# Altium footprint library TranDangKhoa-LIB.PcbLib: 1435 footprints (part 9 of 90)
Each footprint in its own frame and in the unit in brackets; x right, y up, seen from the top. Pads: shape width x height; smd on the part's side, far side on the other; paste and mask are expansions set on the pad; w line width, h text height; cw(c..) or ccw(c..) is an arc to the next point about the centre after c.
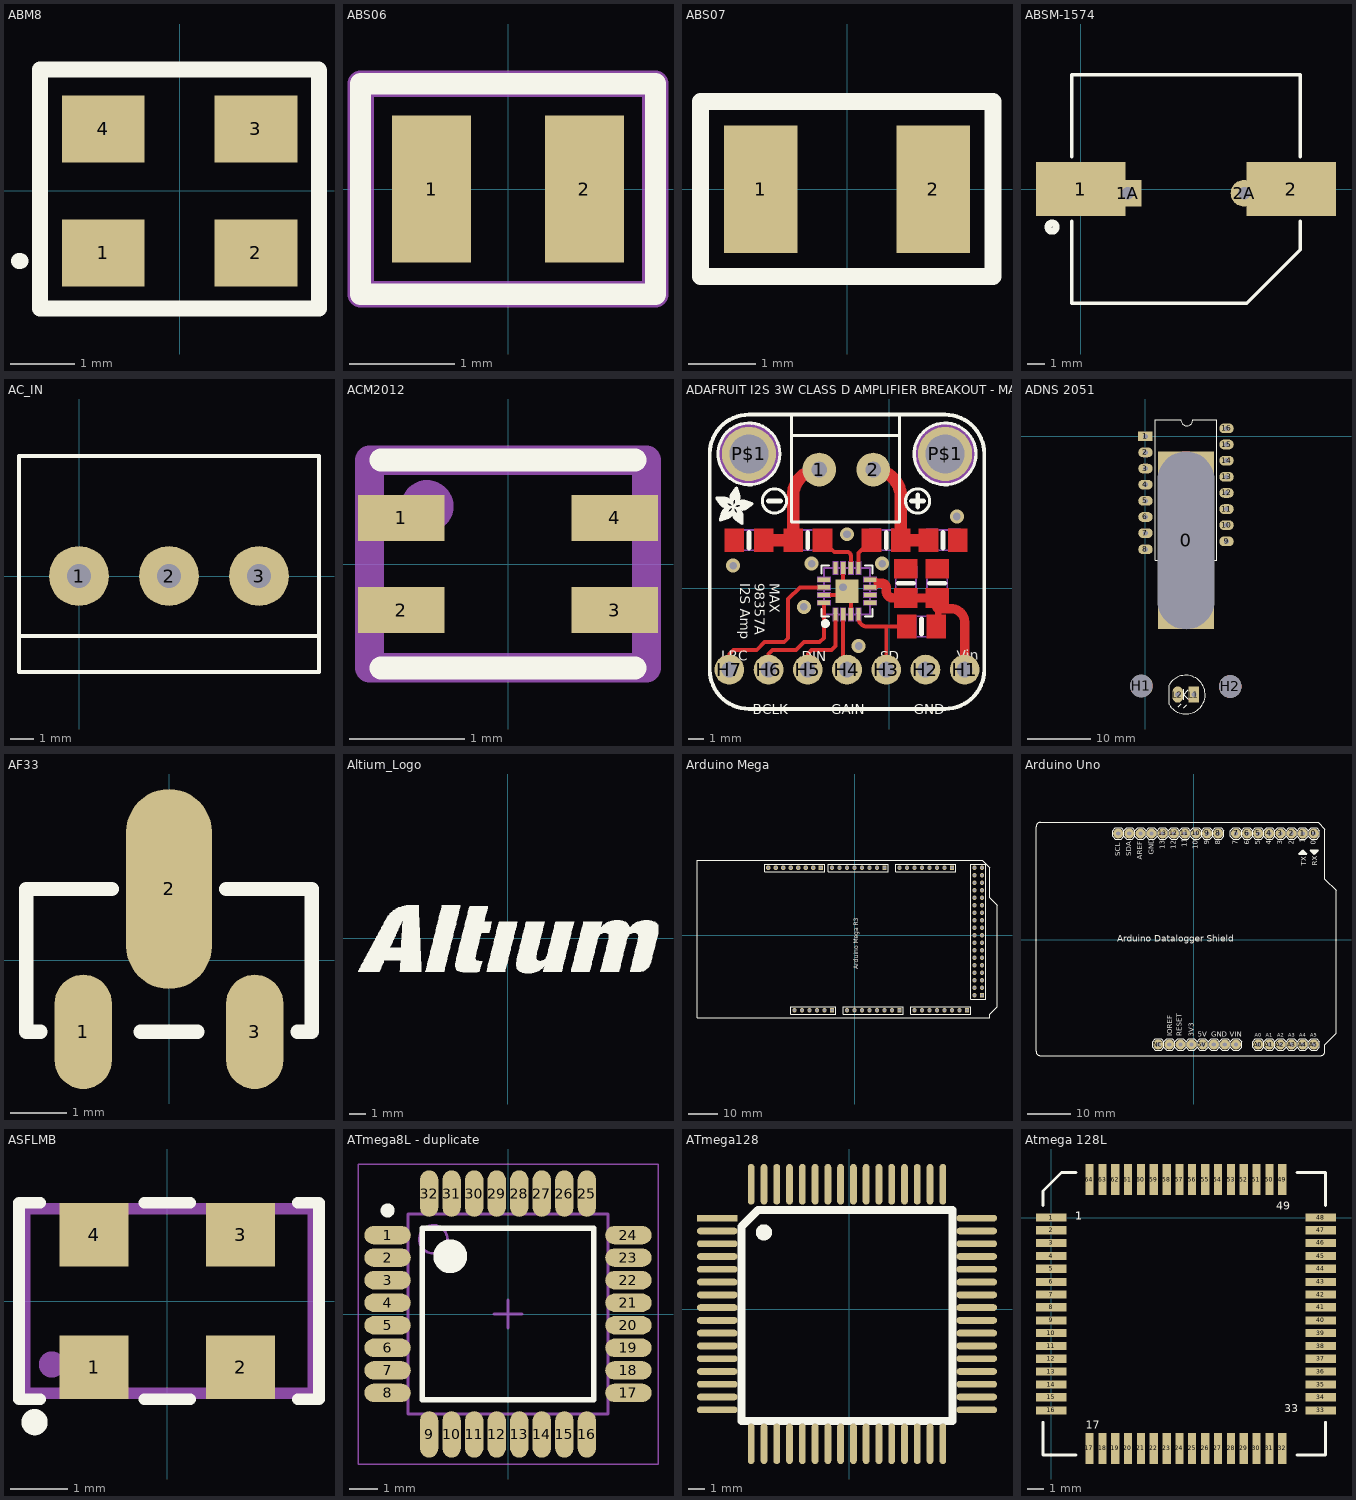
[diagram p8: the footprints below, top view; thin cyan lines are the x and y axes]

## ABM8 [mm] "HC-49US XTAL"
height 4.3
pads (4):
  rect 1.3x1.05 smd: 1(-1.2,-0.97) 2(1.19,-0.97) 3(1.19,0.97) 4(-1.2,0.97)
Top Overlay:
  lines w0.254: -2.52,-1.1 -2.5,-1.1 ; 1.25,1.9 2.17,1.9 2.18,1.89 2.18,-1.84 -2.19,-1.84 -2.19,1.9 2.1,1.9
3D body "ABM8.STEP": height 0.82, standoff 0.02, extent -1.587,-1.346 1.613,1.143

## ABS06 [mm]
pads (2):
  rect 0.75x1.4 smd: 1(-0.725,0) 2(0.725,0)
Top Overlay:
  lines w0.2: -1.4,-1 -1.4,0 -1.4,1 1.4,1 1.4,-1 -1.4,-1
Mechanical 16:
  lines w0.254: -1.4,-1 1.4,-1 1.4,1 -1.4,1 -1.4,-1
Mechanical 29:
  text ".Designator" at -0.5,-0.3 h0.6
3D body "ABS06.STEP": height 0.6, standoff 0, extent -1,-0.62 1,0.6
3D body: height 0.61, standoff 0.5, extent -0.825,-0.36 0.825,0.34

## ABS07 [mm] "HC-49US XTAL"
height 4.3
pads (2):
  rect 1.1x1.9 smd: 1(-1.29,0) 2(1.29,0)
Top Overlay:
  lines w0.254: -2.19,-1.3 2.18,-1.3 2.18,1.31 -2.19,1.31 -2.19,-1.3
3D body "ABS07.STEP": height 0.9, standoff 0.02, extent -1.6,-0.749 1.6,0.749

## ABSM-1574 [mm]
pads (4):
  rect 5x3 smd: 1(0,0) 2(11.8,0)
  rect 1.5x1.5 hole 0.7: 1A(2.65,-0.24)
  round 1.5 hole 0.7: 2A(9.15,-0.24)
Top Overlay:
  circle w0.4: c-1.6,-2.134 r0.227
  lines w0.2: -0.5,-1.8 -0.5,-6.4 9.3,-6.4 12.3,-3.4 12.3,-1.8 ; -0.5,1.8 -0.5,6.4 12.3,6.4 12.3,1.8

## AC_IN [mil] "AC_Input"
height 3
pads (3):
  round 100 hole 40 square: 1(0,0) 2(150,0) 3(300,0)
Top Overlay:
  lines w7: -100,-100 400,-100 ; -100,-160 -100,200 400,200 400,-160 -100,-160

## ACM2012 [mm]
pads (4):
  rect 0.75x0.4 smd mask+0.076: 1(-0.925,0.4) 2(-0.925,-0.4) 3(0.925,-0.4) 4(0.925,0.4)
Top Overlay:
  lines w0.2: -1.1,-0.9 1.1,-0.9 ; -1.1,0.9 1.1,0.9
Mechanical 16:
  circle w0.254: c-0.7,0.5 r0.1
  lines w0.254: -1.2,-0.9 -1.2,0.9 1.2,0.9 1.2,-0.9 -1.2,-0.9
Mechanical 29:
  text ".Designator" at 0.3,0.1 h0.4
3D body: height 1.3, standoff 0, extent -1.2,-0.7 1.2,0.7

## ADAFRUIT I2S 3W CLASS D AMPLIFIER BREAKOUT - MAX98357A [mil]
pads (28):
  round 86 hole 39.36 paste-99999 mask+4: 1(-178.62,301.98) 2(-40.83,301.98)
  rect 11.02x31.5 smd paste+0 mask+4: 1(-137.28,-67.08) 2(-117.59,-67.08) 3(-97.92,-67.08) 4(-78.22,-67.08) 9(-78.22,51.03) 10(-97.92,51.03) 11(-117.59,51.03) 12(-137.28,51.03)
  rect 31.5x11.02 smd paste+0 mask+4: 5(-48.7,-37.55) 6(-48.7,-17.86) 7(-48.7,1.82) 8(-48.7,21.51) 13(-166.81,21.51) 14(-166.81,1.82) 15(-166.81,-17.86) 16(-166.81,-37.55)
  round 76 hole 39.36 paste-99999 mask+4: H1(192.25,-208.02) H2(92.25,-208.02) H3(-7.75,-208.02) H4(-107.75,-208.02) H5(-207.75,-208.02) H6(-307.75,-208.02) H7(-407.75,-208.02)
  round 138.42 hole 98.42 slot 98.62 at 0 deg paste-99999 mask+4: P$1(-357.75,341.98) P$1(142.25,341.98)
  rect 59.05x59.05 smd paste+0 mask+4: THERMAL(-107.75,-8.02)
via -77.92,-147.86 diameter 35.69 hole 19.68
via -197.91,62.14 diameter 35.69 hole 19.68
via -17.91,62.14 diameter 35.69 hole 19.68
via -107.92,137.14 diameter 35.69 hole 19.68
via -397.92,57.14 diameter 35.69 hole 19.68
via 172.09,182.14 diameter 35.69 hole 19.68
via -217.91,-47.86 diameter 35.69 hole 19.68
via -117.92,2.14 diameter 35.69 hole 19.68
Top Layer:
  region: 20.43,-68.49 69.25,-68.49 69.25,-127.55 20.43,-127.55
  region: 95.23,-68.49 144.06,-68.49 144.06,-127.55 95.23,-127.55
  region: 12.71,-49.83 12.71,-1.01 71.78,-1.01 71.78,-49.83
  region: 12.71,24.97 12.71,73.79 71.78,73.79 71.78,24.97
  region: 92.72,-49.83 92.72,-1.01 151.78,-1.01 151.78,-49.83
  region: 92.72,24.97 92.72,73.79 151.78,73.79 151.78,24.97
  region: -69.56,151.51 -20.75,151.51 -20.75,92.45 -69.56,92.45
  region: 5.24,151.51 54.05,151.51 54.05,92.45 5.24,92.45
  region: -145.94,92.45 -194.76,92.45 -194.76,151.51 -145.94,151.51
  region: -220.75,92.45 -269.56,92.45 -269.56,151.51 -220.75,151.51
  region: -295.94,92.45 -344.76,92.45 -344.76,151.51 -295.94,151.51
  region: -370.75,92.45 -419.56,92.45 -419.56,151.51 -370.75,151.51
  region: 75.44,151.51 124.25,151.51 124.25,92.45 75.44,92.45
  region: 150.24,151.51 199.06,151.51 199.06,92.45 150.24,92.45
  lines w10: -407.75,-208.02 -407.75,-168.02 -397.75,-158.02 -337.75,-158.02 -317.75,-138.02 -267.75,-138.02 -257.75,-128.02 -257.75,-28.02 -227.92,1.82 -166.81,1.82 ; -307.75,-208.02 -307.75,-168.02 -297.75,-158.02 -237.75,-158.02 -217.75,-138.02 -177.75,-138.02 -166.81,-127.08 -166.81,-37.55 ; -207.75,-208.02 -207.75,-168.02 -197.75,-158.02 -147.75,-158.02 -137.29,-147.55 -137.29,-67.08 ; -170.35,121.98 -140.35,91.98 -107.75,91.98 cw(c-107.75,82.14) -97.91,82.14 -97.92,51.03 ; -166.81,-17.86 -117.59,-17.86 ccw(c-117.59,-8.02) -107.75,-8.02 ; -117.59,-67.08 -117.59,-198.18 ccw(c-107.75,-198.18) -107.75,-208.02 ; -117.59,51.03 -117.59,1.82 ccw(c-107.75,1.82) -107.75,-8.02 ; -97.92,-67.08 -97.92,-17.86 ccw(c-107.75,-17.86) -107.75,-8.02 ; -78.22,-67.08 -78.22,-77.55 ccw(c-57.76,-77.55) -57.76,-98.02 -7.75,-98.02 ; -78.22,51.03 -78.22,88.91 -45.16,121.98 ; -48.71,1.82 -37.92,1.82 ccw(c-37.91,11.98) -27.75,11.98 ccw(c-37.28,11.98) -37.28,21.51 -48.71,21.51 ; -7.75,-208.02 -7.75,-98.02 ; 44.84,-98.02 -7.75,-98.02
  lines w16: 119.65,-98.02 ccw(c129.64,-102.82) 124.85,-112.82 124.84,-53.02
  lines w24: -27.75,11.98 -17.75,11.98 cw(c-17.75,1.98) -7.75,1.98 -7.75,-8.02 ccw(c9.64,-8.02) 9.64,-25.42 42.24,-25.42 122.25,-25.42 ccw(c137.34,-37.92) 124.84,-53.02 162.25,-53.02 cw(c157.24,-88.03) 192.24,-93.02 192.25,-208.02
  lines w32: -320.35,121.98 -245.16,121.98 -245.16,235.44 cw(c-178.62,235.44) -178.62,301.98 ; -40.82,301.98 cw(c-40.83,231.51) 29.64,231.51 29.65,121.98 99.84,121.98
Top Overlay:
  drawing of 1229 lines, arcs and shapes, not listed
  text "LRC" at -427.75,-185.52 h25
  text "BCLK" at -347.75,-321.12 h25
  text "DIN" at -222.75,-186.12 h25
  text "GAIN" at -147.75,-321.12 h25
  text "SD" at -22.75,-186.12 h25
  text "Vin" at 172.9,-185.51 h25
  text "GND" at 62.24,-321.12 h25
  text "MAX / 98357A / I2S Amp" at -380.25,11.98 h25
Bottom Overlay:
  text "4-8Ω 3W" at 44.74,386.98 h50
Mechanical 15:
  drawing of 68 lines, arcs and shapes, not listed

## ADNS 2051 [mil] "Foots pin for Mouse"
pads (21):
  rect 350x1100 hole 350 slot 1100 at 90 deg: 0(251,-645)
  rect 90x60 hole 31: 1(0,0)
  oval 90x60 hole 31: 2(0,-100) 3(0,-200) 4(0,-300) 5(0,-400) 6(0,-500) 7(0,-600) 8(0,-700) 9(502,-651) 10(502,-551) 11(502,-451) 12(502,-351) 13(502,-251) 14(502,-151) 15(502,-51) 16(502,49)
  round 140 hole 140: H1(-25,-1547) H2(525,-1550)
  rect 65x100 hole 32: L1(300,-1600.5)
  oval 65x100 hole 32: L2(200,-1600.5)
Top Overlay:
  lines w7: 146,-1660.5 146,-1541.5 ; 146.06,-1540.53 cw(c250,-1600.5) 146.49,-1661.21 ; 204,-1675.5 221,-1658.5 ; 218,103 59,103 59,-767 443,-767 443,103 296,103 ; 218.97,101 ccw(c255.99,101) 293,101 ; 236,-1632.5 236,-1566.5 ; 238,-1681.5 255,-1664.5 ; 265,-1629.5 236,-1600.5 265,-1571.5 ; 394.94,-516.95 ccw(c252.8,-525.96) 395,-518
  text "ADNS2051" at 108,-229 h40

## AF33 [mil]
pads (3):
  oval 40x80 smd: 1(-60,-50) 3(60,-50)
  oval 60x140 smd: 2(0,50)
Top Overlay:
  lines w10: -90,-50 -100,-50 -100,50 -60,50 -40,50 ; -20,-50 20,-50 ; 40,50 100,50 100,-50 90,-50

## Altium_Logo [mm] "Altium Logo"
height 12.3
Top Overlay:
  drawing of 1243 lines, arcs and shapes, not listed

## Arduino Mega [mm] "Arduino Mega 2560"
pads (82):
  rect 1.5x1.5 hole 0.9: 0(10.16,22.86) 8(-11.43,22.86) 21(33.02,22.86) 59(-7.62,-25.4) 67(15.24,-25.4) 75(38.1,-25.4) 79(43.18,-20.32)
  round 1.5 hole 0.9: 1(7.62,22.86) 2(5.08,22.86) 3(2.54,22.86) 4(0,22.86) 5(-2.54,22.86) 6(-5.08,22.86) 7(-7.62,22.86) 9(-13.97,22.86) 10(-16.51,22.86) 11(-19.05,22.86) 12(-21.59,22.86) 13(-24.13,22.86) 14(15.24,22.86) 15(17.78,22.86) 16(20.32,22.86) 17(22.86,22.86) 18(25.4,22.86) 19(27.94,22.86) 20(30.48,22.86) 22(40.64,20.32) 23(43.18,20.32) 24(40.64,17.78) 25(43.18,17.78) 26(40.64,15.24) 27(43.18,15.24) 28(40.64,12.7) 29(43.18,12.7) 30(40.64,10.16) 31(43.18,10.16) 32(40.64,7.62) 33(43.18,7.62) 34(40.64,5.08) 35(43.18,5.08) 36(40.64,2.54) 37(43.18,2.54) 38(40.64,0) 39(43.18,0) 40(40.64,-2.54) 41(43.18,-2.54) 42(40.64,-5.08) 43(43.18,-5.08) 44(40.64,-7.62) 45(43.18,-7.62) 46(40.64,-10.16) 47(43.18,-10.16) 48(40.64,-12.7) 49(43.18,-12.7) 50(40.64,-15.24) 51(43.18,-15.24) 52(40.64,-17.78) 53(43.18,-17.78) 54(-20.32,-25.4) 55(-17.78,-25.4) 56(-15.24,-25.4) 57(-12.7,-25.4) 58(-10.16,-25.4) 60(-2.54,-25.4) 61(0,-25.4) 62(2.54,-25.4) 63(5.08,-25.4) 64(7.62,-25.4) 65(10.16,-25.4) 66(12.7,-25.4) 68(20.32,-25.4) 69(22.86,-25.4) 70(25.4,-25.4) 71(27.94,-25.4) 72(30.48,-25.4) 73(33.02,-25.4) 74(35.56,-25.4) 76(-26.67,22.86) 77(-29.21,22.86) 78(40.64,-20.32) 80(43.18,22.86) 81(40.64,22.86)
Top Overlay:
  lines w0.2: -30.48,21.59 -30.48,24.13 -10.16,24.13 -10.16,21.59 -30.48,21.59 ; -21.59,-26.67 -6.35,-26.67 -6.35,-24.13 -21.59,-24.13 -21.59,-26.67 ; -8.89,21.59 -8.89,24.13 11.43,24.13 11.43,21.59 -8.89,21.59 ; -3.81,-26.67 -3.81,-24.13 16.51,-24.13 16.51,-26.67 -3.81,-26.67 ; 13.97,21.59 34.29,21.59 34.29,24.13 13.97,24.13 13.97,21.59 ; 19.05,-26.67 19.05,-24.13 39.37,-24.13 39.37,-26.67 19.05,-26.67 ; 39.37,-21.59 39.37,24.13 44.45,24.13 44.45,-21.59 39.37,-21.59
  lines w0.254: 45.72,12.69 48.26,10.15 48.26,-24.13 45.72,-26.67 45.72,-27.94 -51.7,-27.94 -53.34,-27.94 -53.34,-26.3 -53.34,25.4 43.18,25.4 45.72,22.86 45.72,12.7
  text "Arduino Mega R3" at 1.27,-11.43 h1.52

## Arduino Uno [mm]
pads (32):
  round 2.3 hole 1: 0(27.44,24.26) 1(24.9,24.26) 2(22.36,24.26) 3(19.82,24.26) 3.3V(-0.5,-24) 4(17.28,24.26) 5(14.74,24.26) 5V(2.04,-24) 6(12.2,24.26) 7(9.66,24.26) 8(5.596,24.26) 9(3.056,24.26) 10(0.516,24.26) 11(-2.024,24.26) 12(-4.564,24.26) 13(-7.104,24.26) A0(14.74,-24) A1(17.28,-24) A2(19.82,-24) A3(22.36,-24) A4(24.9,-24) A5(27.44,-24) AREF(-12.184,24.26) GND1(7.12,-24) GND2(4.58,-24) GND3(-9.644,24.26) IOREF(-5.58,-24) NC(-8.12,-24) RST(-3.04,-24) SCL(-17.264,24.26) SDA(-14.724,24.26) Vin(9.66,-24)
Top Overlay:
  drawing of 255 lines, arcs and shapes, not listed
  text "Arduino Datalogger Shield" at -17.5,-0.5 h1.52
  text "SDA" at -14.271,19.087 h1.21
  text "SCL" at -16.8,19.1 h1.21
  text "0" at 27.887,21.676 h1.21
  text "1" at 25.347,22.079 h1.21
  text "2" at 22.807,21.676 h1.21
  text "3" at 20.267,21.676 h1.21
  text "4" at 17.727,21.676 h1.21
  text "5" at 15.187,21.676 h1.21
  text "6" at 12.647,21.676 h1.21
  text "7" at 10.107,21.676 h1.21
  text "8" at 6.043,21.676 h1.21
  text "9" at 3.503,21.676 h1.21
  text "10" at 0.963,20.669 h1.21
  text "11" at -1.577,21.072 h1.21
  text "12" at -4.117,20.669 h1.21
  text "13" at -6.657,20.669 h1.21
  text "RX" at 28.202,16.894 h1.21
  text "TX" at 25.662,16.919 h1.21
  text "IOREF" at -4.945,-22.095 h1.21
  text "GND" at 3.97,-22.222 h1.21
  text "VIN" at 8.263,-22.222 h1.21
  text "A5" at 26.653,-22.197 h0.86
  text "A4" at 24.113,-22.197 h0.86
  text "A3" at 21.573,-22.197 h0.86
  text "A2" at 19.033,-22.197 h0.86
  text "A1" at 16.493,-22.197 h0.86
  text "3V3" at 0.008,-22.222 h1.21
  text "RESET" at -2.786,-22.095 h1.21
  text "GND" at -9.172,19.386 h1.21
  text "AREF" at -11.814,18.203 h1.21
  text "A0" at 13.953,-22.197 h0.86
  text "5V" at 0.897,-22.222 h1.21

## ASFLMB [mm] "Creator MM"
height 0.9
pads (4):
  rect 1.2x1.1 smd: 1(-1.27,-1.15) 2(1.27,-1.15) 3(1.27,1.15) 4(-1.27,1.15)
Top Overlay:
  circle w0.254: c-2.3,-2.1 r0.1
  lines w0.2: -2.2,-1.7 -2.57,-1.7 -2.57,1.7 -2.2,1.7 ; -0.4,-1.7 0.4,-1.7 ; -0.4,1.7 0.4,1.7 ; 2.26,-1.7 2.63,-1.7 2.63,1.7 2.26,1.7
Mechanical 16:
  circle w0.254: c-2,-1.1 r0.1
  lines w0.2: -2.47,-1.6 2.53,-1.6 2.53,1.6 -2.47,1.6 -2.47,-1.6
Mechanical 29:
  text ".Designator" at 0.3,-0.5 h0.8
3D body: height 0.9, standoff 0, extent -2.47,-1.6 2.53,1.6

## ATmega8L - duplicate [mm] "TQFP, 32-Leads, Body 7.10x7.10mm, Pitch 0.80mm, IPC Medium Density"
height 1.2
pads (32):
  oval 1.65x0.65 smd: 1(-4.275,2.8) 2(-4.275,2) 3(-4.275,1.2) 4(-4.275,0.4) 5(-4.275,-0.4) 6(-4.275,-1.2) 7(-4.275,-2) 8(-4.275,-2.8) 17(4.275,-2.8) 18(4.275,-2) 19(4.275,-1.2) 20(4.275,-0.4) 21(4.275,0.4) 22(4.275,1.2) 23(4.275,2) 24(4.275,2.8)
  oval 0.65x1.65 smd: 9(-2.8,-4.275) 10(-2,-4.275) 11(-1.2,-4.275) 12(-0.4,-4.275) 13(0.4,-4.275) 14(1.2,-4.275) 15(2,-4.275) 16(2.8,-4.275) 25(2.8,4.275) 26(2,4.275) 27(1.2,4.275) 28(0.4,4.275) 29(-0.4,4.275) 30(-1.2,4.275) 31(-2,4.275) 32(-2.8,4.275)
Top Overlay:
  circle w0.25: c-4.275,3.675 r0.125
  circle w0.6: c-2.05,2.05 r0.3
  lines w0.2: -3.05,-3.05 -3.05,3.05 3.05,3.05 3.05,-3.05 -3.05,-3.05
Mechanical 13:
  circle w0.1: c-2.65,2.65 r0.5
  lines w0.1: -3.55,-3.55 -3.55,3.55 3.55,3.55 3.55,-3.55 -3.55,-3.55
Mechanical 15:
  lines w0.05: -5.325,-5.325 -5.325,5.325 5.325,5.325 5.325,-5.325 -5.325,-5.325
  lines w0.1: -0.5,0 0.5,0 ; 0,-0.5 0,0.5
3D body: height 1.2, standoff 0.15, extent -3.55,-3.55 3.55,3.55

## ATmega128 [mm] "Atmega128"
pads (64):
  rect 2.54x0.432 smd: 1(-8.255,5.715)
  oval 2.54x0.432 smd: 2(-8.255,4.915) 3(-8.255,4.115) 4(-8.255,3.315) 5(-8.255,2.515) 6(-8.255,1.715) 7(-8.255,0.915) 8(-8.255,0.115) 9(-8.255,-0.685) 10(-8.255,-1.485) 11(-8.255,-2.285) 12(-8.255,-3.085) 13(-8.255,-3.885) 14(-8.255,-4.685) 15(-8.255,-5.485) 16(-8.255,-6.285) 33(7.995,-6.285) 34(7.995,-5.485) 35(7.995,-4.685) 36(7.995,-3.885) 37(7.995,-3.085) 38(7.995,-2.285) 39(7.995,-1.485) 40(7.995,-0.685) 41(7.995,0.115) 42(7.995,0.915) 43(7.995,1.715) 44(7.995,2.515) 45(7.995,3.315) 46(7.995,4.115) 47(7.995,4.915) 48(7.995,5.715)
  oval 0.432x2.54 smd: 17(-6.13,-8.41) 18(-5.33,-8.41) 19(-4.53,-8.41) 20(-3.73,-8.41) 21(-2.93,-8.41) 22(-2.13,-8.41) 23(-1.33,-8.41) 24(-0.53,-8.41) 25(0.27,-8.41) 26(1.07,-8.41) 27(1.87,-8.41) 28(2.67,-8.41) 29(3.47,-8.41) 30(4.27,-8.41) 31(5.07,-8.41) 32(5.87,-8.41) 49(5.87,7.84) 50(5.07,7.84) 51(4.27,7.84) 52(3.47,7.84) 53(2.67,7.84) 54(1.87,7.84) 55(1.07,7.84) 56(0.27,7.84) 57(-0.53,7.84) 58(-1.33,7.84) 59(-2.13,7.84) 60(-2.93,7.84) 61(-3.73,7.84) 62(-4.53,7.84) 63(-5.33,7.84) 64(-6.13,7.84)
Top Overlay:
  circle w0.508: c-5.334,4.826 r0.254
  lines w0.508: -6.731,-6.985 -6.731,5.207 -5.715,6.223 6.477,6.223 6.477,-6.985 -6.731,-6.985

## Atmega 128L [mil] "Atmega 128L, 64 pin SMT"
height 100
pads (64):
  rect 75x20 smd: 1(0,0) 2(0,-31) 3(0,-62) 4(0,-94) 5(0,-125) 6(0,-157) 7(0,-188) 8(0,-219) 9(0,-251) 10(0,-282) 11(0,-314) 12(0,-345) 13(0,-376) 14(0,-408) 15(0,-439) 16(0,-471) 33(658,-471) 34(658,-439) 35(658,-408) 36(658,-376) 37(658,-345) 38(658,-314) 39(658,-282) 40(658,-251) 41(658,-219) 42(658,-188) 43(658,-157) 44(658,-125) 45(658,-94) 46(658,-62) 47(658,-31) 48(658,0)
  rect 20x75 smd: 17(93,-564) 18(125,-564) 19(156,-564) 20(187,-564) 21(219,-564) 22(250,-564) 23(282,-564) 24(313,-564) 25(344,-564) 26(376,-564) 27(407,-564) 28(439,-564) 29(470,-564) 30(501,-564) 31(533,-564) 32(564,-564) 49(564,93) 50(533,93) 51(501,93) 52(470,93) 53(439,93) 54(407,93) 55(376,93) 56(344,93) 57(313,93) 58(282,93) 59(250,93) 60(219,93) 61(187,93) 62(156,93) 63(125,93) 64(93,93)
Top Overlay:
  lines w7: -20,-500 -20,-580 60,-580 ; -20,30 -20,65 25,110 60,110 ; 600,-580 670,-580 670,-500 ; 600,110 670,110 670,30
  text "1" at 59,-5.5 h20
  text "1" at 59,-5.5 h20
  text "49" at 549,19.5 h20
  text "17" at 84,-515.5 h20
  text "33" at 569,-475.5 h20